# Altium footprint library PcbLib1.PcbLib: 51 footprints (part 4 of 4)
Each footprint in its own frame and in the unit in brackets; x right, y up, seen from the top. Pads: shape width x height; smd on the part's side, far side on the other; paste and mask are expansions set on the pad; w line width, h text height; cw(c..) or ccw(c..) is an arc to the next point about the centre after c.
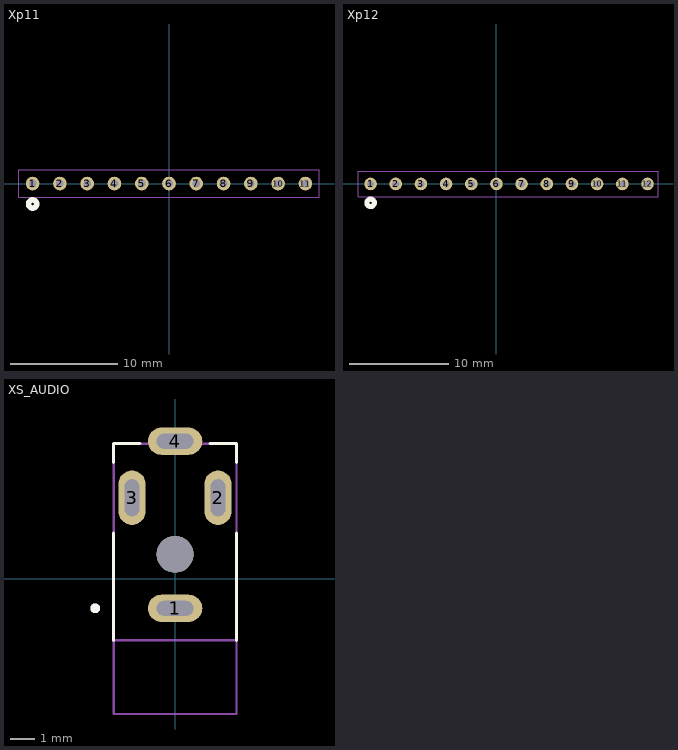
[diagram p3: the footprints below, top view; thin cyan lines are the x and y axes]

## Xp11 [mil]
pads (11):
  round 50 hole 28 paste-25 mask+0: 1(-500,0) 2(-400,0) 3(-300,0) 4(-200,0) 5(-100,0) 6(0,0) 7(100,0) 8(200,0) 9(300,0) 10(400,0) 11(500,0)
Top Overlay:
  circle w20: c-500,-75 r15
Bottom Overlay:
  circle w20: c-500,-75 r15
Top Assembly:
  lines w3.94: -550,-50 550,-50 550,50 -550,50 -550,-50
Mechanical 13:
  circle w1: c-500,0 r10
3D body "xp11.stp": height 326, standoff -151, extent -552.03,-49.01 555.97,50.99
3D body "xp11.stp": height 326, standoff -151, extent -553.99,-49.99 554.01,50.01

## Xp12 [mil]
pads (12):
  round 50 hole 28 paste-25 mask+0: 1(-500,0) 2(-400,0) 3(-300,0) 4(-200,0) 5(-100,0) 6(0,0) 7(100,0) 8(200,0) 9(300,0) 10(400,0) 11(500,0) 12(600,0)
Top Overlay:
  circle w20: c-500,-75 r15
Bottom Overlay:
  circle w20: c-500,-75 r15
Top Assembly:
  lines w3.94: -550,-50 -550,50 641.73,50 641.73,-50 -550,-50
Mechanical 13:
  circle w1: c-500,0 r10

## XS_AUDIO [mm]
pads (5):
  oval 2.216x1.108 hole 0.6 slot 1.5 at 0 deg mask+0.102: 1(0,-1.2) 4(0,5.6)
  oval 1.108x2.216 hole 0.6 slot 1.5 at 90 deg mask+0.102: 2(1.75,3.3) 3(-1.75,3.3)
  round 1.5 hole 1.5 unplated mask+0: ""(0,1)
Top Overlay:
  circle w0.2: c-3.25,-1.2 r0.1
  lines w0.127: -2.5,-2.5 -2.5,1.872 ; -2.5,4.728 -2.5,5.5 -1.428,5.5 ; 1.428,5.5 2.5,5.5 2.5,4.728 ; 2.5,-2.5 2.5,1.872
Top Assembly:
  lines w0.1: -2.5,-2.5 -2.5,5.5 2.5,5.5 2.5,-2.5 ; -2.5,-2.5 -2.5,-5.5 2.5,-5.5 2.5,-2.5 ; -2.5,-2.5 2.5,-2.5
Mechanical 13:
  circle w0.2: c-3.25,-1.2 r0.1
3D body "step_temp.STEP": height 2.29, standoff -5.23, extent -2.467,-5.75 2.533,5.5